# Altium footprint library LION.PcbLib: 90 footprints (part 11 of 13)
Each footprint in its own frame and in the unit in brackets; x right, y up, seen from the top. Pads: shape width x height; smd on the part's side, far side on the other; paste and mask are expansions set on the pad; w line width, h text height; cw(c..) or ccw(c..) is an arc to the next point about the centre after c.
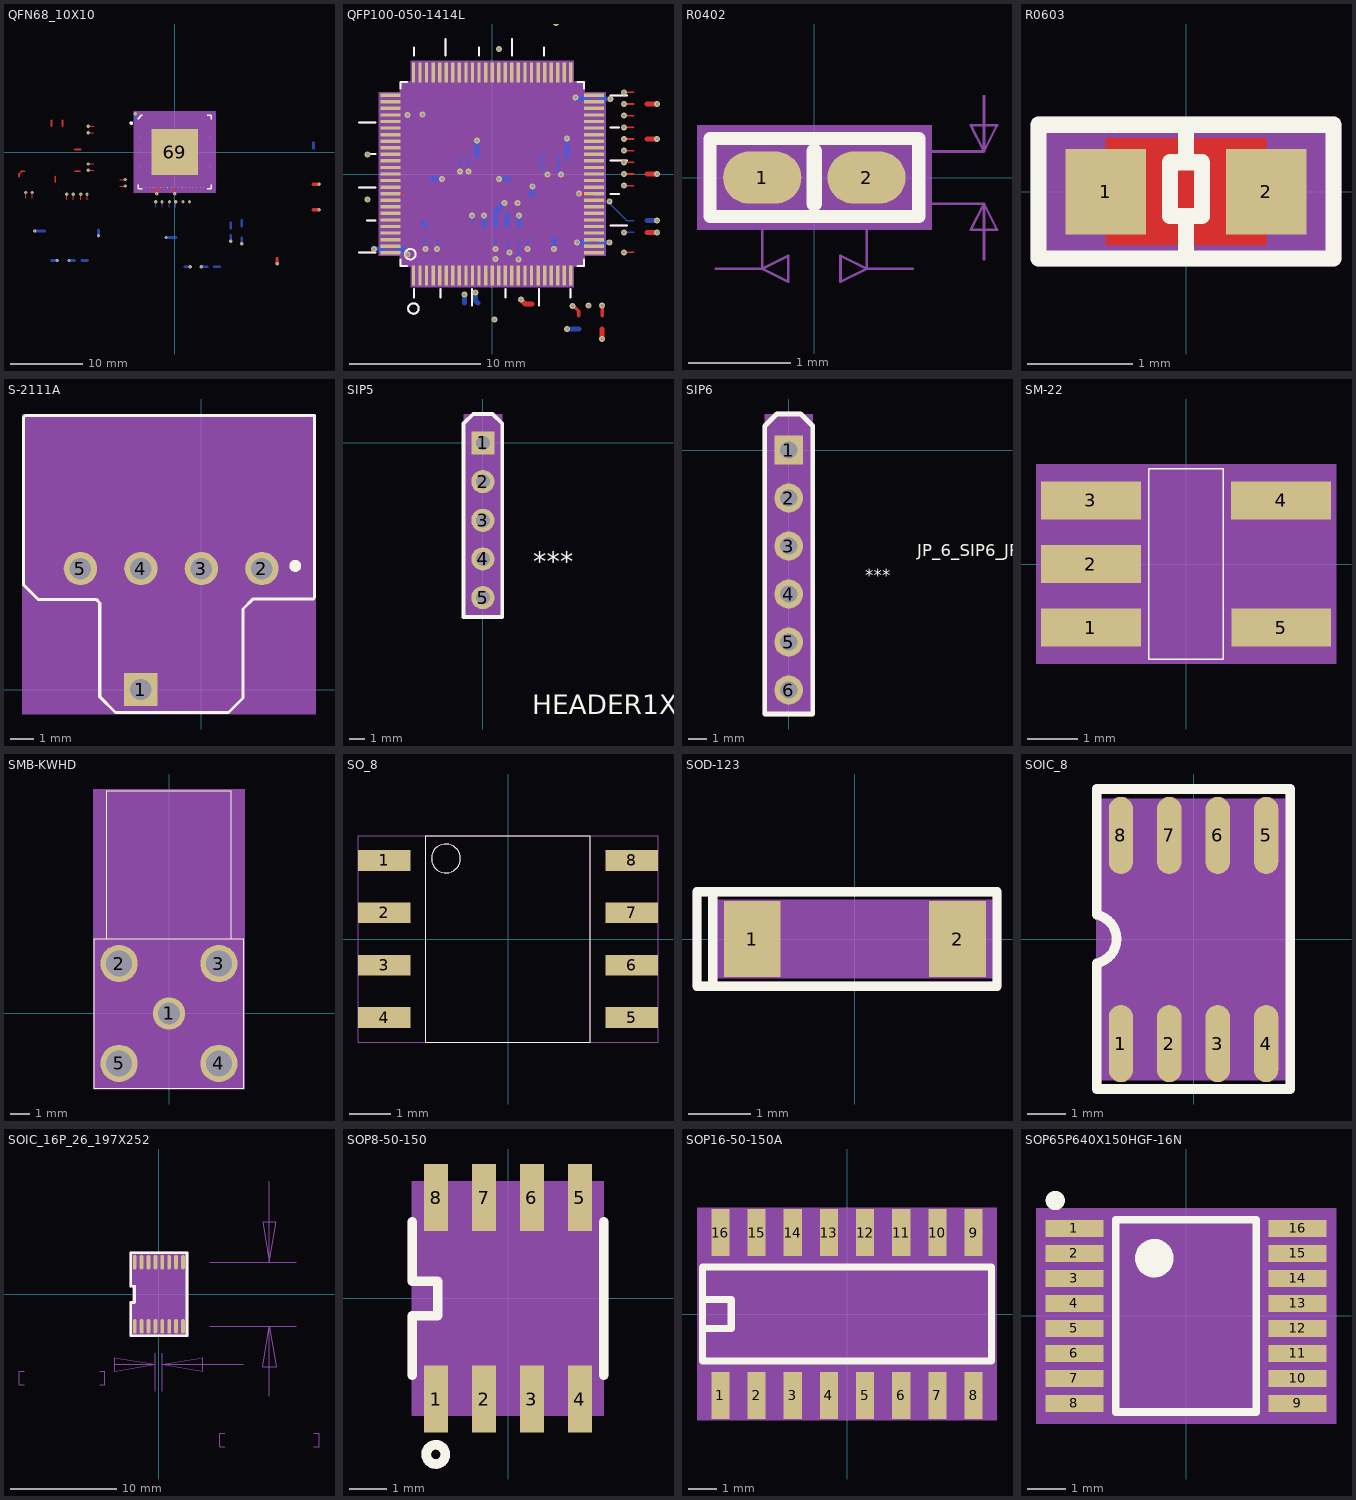
[diagram p10: the footprints below, top view; thin cyan lines are the x and y axes]

## QFN68_10X10 [mil] "QFN68_10X10"
pads (69):
  oct 1x1 smd: 1(-192.91,157.48) 2(-192.91,137.8) 3(-192.91,118.11) 4(-192.91,98.43) 5(-192.91,78.74) 6(-192.91,59.06) 7(-192.91,39.37) 8(-192.91,19.69) 9(-192.91,0) 10(-192.91,-19.69) 11(-192.91,-39.37) 12(-192.91,-59.06) 13(-192.91,-78.74) 14(-192.91,-98.43) 15(-192.91,-118.11) 16(-192.91,-137.8) 17(-192.91,-157.48) 18(-157.48,-192.91) 19(-137.8,-192.91) 20(-118.11,-192.91) 21(-98.43,-192.91) 22(-78.74,-192.91) 23(-59.06,-192.91) 24(-39.37,-192.91) 25(-19.69,-192.91) 26(0,-192.91) 27(19.69,-192.91) 28(39.37,-192.91) 29(59.06,-192.91) 30(78.74,-192.91) 31(98.43,-192.91) 32(118.11,-192.91) 33(137.8,-192.91) 34(157.48,-192.91) 35(192.91,-157.48) 36(192.91,-137.8) 37(192.91,-118.11) 38(192.91,-98.43) 39(192.91,-78.74) 40(192.91,-59.06) 41(192.91,-39.37) 42(192.91,-19.69) 43(192.91,0) 44(192.91,19.69) 45(192.91,39.37) 46(192.91,59.06) 47(192.91,78.74) 48(192.91,98.43) 49(192.91,118.11) 50(192.91,137.8) 51(192.91,157.48) 52(157.48,192.91) 53(137.8,192.91) 54(118.11,192.91) 55(98.43,192.91) 56(78.74,192.91) 57(59.06,192.91) 58(39.37,192.91) 59(19.69,192.91) 60(0,192.91) 61(-19.69,192.91) 62(-39.37,192.91) 63(-59.06,192.91) 64(-78.74,192.91) 65(-98.43,192.91) 66(-118.11,192.91) 67(-137.8,192.91) 68(-157.48,192.91)
  rect 251.97x251.97 smd: 69(0,0)
via 80,-270 diameter 18 hole 10
via 45,-270 diameter 18 hole 10
via -270,-185 diameter 18 hole 10
via -270,-150 diameter 18 hole 10
via -810,-220.5 diameter 18 hole 10
via -477,-230.5 diameter 18 hole 10
via -775,-220.5 diameter 18 hole 10
via -470,-65 diameter 18 hole 10
via -512,-230.5 diameter 18 hole 10
via -587,-230.5 diameter 18 hole 10
via -470,105 diameter 18 hole 10
via -470,140 diameter 18 hole 10
via -470,-100 diameter 18 hole 10
via -552,-230.5 diameter 18 hole 10
via -69,-270.5 diameter 18 hole 10
via -29,-270.5 diameter 18 hole 10
via 6,-270.5 diameter 18 hole 10
via -104,-270.5 diameter 18 hole 10
via -98.43,-227.6 diameter 18 hole 10
via 0,-227.6 diameter 18 hole 10
via 785,-175 diameter 18 hole 10
via 785,-315 diameter 18 hole 10
via 557,-608 diameter 18 hole 10
via 365,-498.5 diameter 18 hole 10
via 305,-485 diameter 18 hole 10
via 85,-625 diameter 18 hole 10
via 145,-625 diameter 18 hole 10
via -47.45,-465 diameter 18 hole 10
via -415,-455 diameter 18 hole 10
via -215,208.5 diameter 18 hole 10
via -575,-590 diameter 18 hole 10
via -640,-590 diameter 18 hole 10
via -762.45,-430 diameter 18 hole 10
Top Layer:
  lines w4: -810,-250.5 -810,-220.5 ; -775,-250.5 -775,-220.5 ; -587,-260.5 -587,-230.5 ; -552,-260.5 -552,-230.5 ; -512,-260.5 -512,-230.5 ; -477,-260.5 -477,-230.5 ; -470,-100 -440,-100 ; -470,-65 -440,-65 ; -470,105 -440,105 ; -470,140 -440,140 ; -300,-185 -270,-185 ; -300,-150 -270,-150
  lines w10: -847.55,-134.84 -847.55,-119.83 -831.99,-104.27 -815.83,-104.27 ; -670.16,139.83 -670.16,171.56 ; -650.47,-163.56 -650.47,-131.83 ; -611.1,139.83 -611.1,171.56 ; -544.17,-104.27 -515.7,-104.27 ; -544.17,13.84 -512.44,13.84 ; -98.43,-227.6 -98.43,-192.91 ; 0,-227.6 0,-192.91
  lines w15: 557,-608 557,-578
  lines w20: 755,-315 785,-315 ; 755,-175 785,-175
Bottom Layer:
  lines w4: -104,-300.5 -104,-270.5 ; -69,-300.5 -69,-270.5 ; -29,-300.5 -29,-270.5 ; 6,-300.5 6,-270.5
  lines w15: -762.45,-430 -707.5,-430 ; -670,-590 -640,-590 ; -575,-590 -545,-590 ; -505,-590 -475,-590 ; -415,-455 -415,-425 ; -215,177.5 -215,208.5 ; -47.45,-465 7.5,-465 ; 55,-625 85,-625 ; 145,-625 175,-625 ; 215,-625 245,-625 ; 305,-485 305,-455 ; 305,-415 305,-385 ; 365,-498.5 365,-467.5 ; 365,-402.5 365,-371.5 ; 755,20 755,50
Top Overlay:
  circle w9.84: c-236.22,157.48 r4.92
  lines w7.87: -198.82,-177.17 -198.82,-198.82 -177.17,-198.82 ; -198.82,177.17 -198.82,181.5 -181.5,198.82 -177.17,198.82 ; 177.17,-198.82 198.82,-198.82 198.82,-177.17 ; 177.17,198.82 198.82,198.82 198.82,177.17
  text ".Designator" at -135.05,-314.83 h25
Top Paste:
  pour cut-out: -94.88,-94.88 -94.88,-15.35 -15.35,-15.35 -15.35,-94.88
  pour cut-out: 15.35,-94.88 15.35,-15.35 94.88,-15.35 94.88,-94.88
  pour cut-out: -94.88,15.35 -94.88,94.88 -15.35,94.88 -15.35,15.35
  pour cut-out: 15.35,15.35 15.35,94.88 94.88,94.88 94.88,15.35
Mechanical 5:
  circle w9.84: c-236.22,157.48 r4.92
  lines w7.87: -198.82,-177.17 -198.82,-198.82 -177.17,-198.82 ; -198.82,177.17 -198.82,181.5 -181.5,198.82 -177.17,198.82 ; 177.17,-198.82 198.82,-198.82 198.82,-177.17 ; 177.17,198.82 198.82,198.82 198.82,177.17
  text "HMC7044LP10BE_0_QFN68_10X10_HMC" at 0,-590.47 h50
  text "U113" at -213.38,-358.18 h25
Mechanical 14:
  text "61" at -19.69,172.91 h25
  text "54" at 118.11,172.91 h25
  text "29" at 59.06,-212.91 h25
  text "30" at 78.74,-212.91 h25
  text "4" at -192.91,88.43 h25
  text "59" at 19.69,172.91 h25
  text "58" at 39.37,172.91 h25
  text "28" at 39.37,-212.91 h25
  text "27" at 19.69,-212.91 h25
  text "16" at -192.91,-157.8 h25
  text "15" at -192.91,-138.11 h25
  text "60" at 0,172.91 h25
  text "53" at 137.8,172.91 h25
  text "13" at -192.91,-98.74 h25
  text "14" at -192.91,-118.43 h25
  text "2" at -192.91,127.8 h25
  text "23" at -59.06,-212.91 h25
  text "3" at -192.91,108.11 h25
  text "1" at -192.91,147.48 h25
  text "24" at -39.37,-212.91 h25
  text "25" at -19.69,-212.91 h25
  text "22" at -78.74,-212.91 h25
  text "47" at 192.91,58.74 h25
  text "34" at 157.48,-212.91 h25
  text "33" at 137.8,-212.91 h25
  text "43" at 192.91,-20 h25
  text "42" at 192.91,-39.69 h25
  text "40" at 192.91,-79.06 h25
  text "39" at 192.91,-98.74 h25
  text "67" at -137.8,172.91 h25
  text "48" at 192.91,78.43 h25
  text "32" at 118.11,-212.91 h25
  text "65" at -98.43,172.91 h25
  text "45" at 192.91,19.37 h25
  text "55" at 98.43,172.91 h25
  text "7" at -192.91,29.37 h25
  text "46" at 192.91,39.06 h25
  text "64" at -78.74,172.91 h25
  text "9" at -192.91,-10 h25
  text "11" at -192.91,-59.37 h25
  text "12" at -192.91,-79.06 h25
  text "5" at -192.91,68.74 h25
  text "49" at 192.91,98.11 h25
  text "31" at 98.43,-212.91 h25
  text "52" at 157.48,172.91 h25
  text "63" at -59.06,172.91 h25
  text "62" at -39.37,172.91 h25
  text "6" at -192.91,49.06 h25
  text "20" at -118.11,-212.91 h25
  text "19" at -137.8,-212.91 h25
  text "18" at -157.48,-212.91 h25
  text "44" at 192.91,-0.31 h25
  text "50" at 192.91,117.8 h25
  text "66" at -118.11,172.91 h25
  text "8" at -192.91,9.69 h25
  text "51" at 192.91,137.48 h25
  text "10" at -192.91,-39.69 h25
  text "38" at 192.91,-118.43 h25
  text "21" at -98.43,-212.91 h25
  text "41" at 192.91,-59.37 h25
  text "26" at 0,-212.91 h25
  text "17" at -192.91,-177.48 h25
  text "68" at -157.48,172.91 h25
  text "57" at 59.06,172.91 h25
  text "56" at 78.74,172.91 h25
  text "37" at 192.91,-138.11 h25
  text "36" at 192.91,-157.8 h25
  text "35" at 192.91,-177.48 h25
  text "69" at 0,-20 h25
Mechanical 16:
  circle w3.94: c-158.46,158.46 r19.69
  circle w1.97: c0,0 r13.78
  pour cut-out: -222.44,-222.44 -222.44,222.44 222.44,222.44 222.44,-222.44
  region: -222.44,-222.44 -222.44,222.44 222.44,222.44 222.44,-222.44
  lines w1.97: -19.69,0 19.69,0 ; 0,-19.69 0,19.69
  lines w3.94: -197.83,-197.83 -197.83,197.83 197.83,197.83 197.83,-197.83 -197.83,-197.83
3D body: height 150, standoff 0, extent -222.44,-222.44 222.44,222.44

## QFP100-050-1414L [mil] "QFP100-050-1414L"
pads (100):
  rect 10x60 smd: 1(-236.22,-305.12) 2(-216.54,-305.12) 3(-196.85,-305.12) 4(-177.17,-305.12) 5(-157.48,-305.12) 6(-137.8,-305.12) 7(-118.11,-305.12) 8(-98.43,-305.12) 9(-78.74,-305.12) 10(-59.06,-305.12) 11(-39.37,-305.12) 12(-19.69,-305.12) 13(0,-305.12) 14(19.69,-305.12) 15(39.37,-305.12) 16(59.06,-305.12) 17(78.74,-305.12) 18(98.43,-305.12) 19(118.11,-305.12) 20(137.8,-305.12) 21(157.48,-305.12) 22(177.17,-305.12) 23(196.85,-305.12) 24(216.54,-305.12) 25(236.22,-305.12) 51(236.22,305.12) 52(216.54,305.12) 53(196.85,305.12) 54(177.17,305.12) 55(157.48,305.12) 56(137.8,305.12) 57(118.11,305.12) 58(98.43,305.12) 59(78.74,305.12) 60(59.06,305.12) 61(39.37,305.12) 62(19.69,305.12) 63(0,305.12) 64(-19.69,305.12) 65(-39.37,305.12) 66(-59.06,305.12) 67(-78.74,305.12) 68(-98.43,305.12) 69(-118.11,305.12) 70(-137.8,305.12) 71(-157.48,305.12) 72(-177.17,305.12) 73(-196.85,305.12) 74(-216.54,305.12) 75(-236.22,305.12)
  rect 60x10 smd: 26(305.12,-236.22) 27(305.12,-216.54) 28(305.12,-196.85) 29(305.12,-177.17) 30(305.12,-157.48) 31(305.12,-137.8) 32(305.12,-118.11) 33(305.12,-98.43) 34(305.12,-78.74) 35(305.12,-59.06) 36(305.12,-39.37) 37(305.12,-19.69) 38(305.12,0) 39(305.12,19.69) 40(305.12,39.37) 41(305.12,59.06) 42(305.12,78.74) 43(305.12,98.43) 44(305.12,118.11) 45(305.12,137.8) 46(305.12,157.48) 47(305.12,177.17) 48(305.12,196.85) 49(305.12,216.54) 50(305.12,236.22) 76(-305.12,236.22) 77(-305.12,216.54) 78(-305.12,196.85) 79(-305.12,177.17) 80(-305.12,157.48) 81(-305.12,137.8) 82(-305.12,118.11) 83(-305.12,98.43) 84(-305.12,78.74) 85(-305.12,59.06) 86(-305.12,39.37) 87(-305.12,19.69) 88(-305.12,0) 89(-305.12,-19.69) 90(-305.12,-39.37) 91(-305.12,-59.06) 92(-305.12,-78.74) 93(-305.12,-98.43) 94(-305.12,-118.11) 95(-305.12,-137.8) 96(-305.12,-157.48) 97(-305.12,-177.17) 98(-305.12,-196.85) 99(-305.12,-216.54) 100(-305.12,-236.22)
via 10,-255 diameter 18 hole 10
via 260.12,-59.06 diameter 18 hole 10
via 166.45,-1.84 diameter 18 hole 10
via 10,-225 diameter 18 hole 10
via 395,-175 diameter 18 hole 10
via -71.02,7.52 diameter 18 hole 10
via 395,-235 diameter 18 hole 10
via 351.5,-205 diameter 18 hole 10
via 355,225 diameter 18 hole 10
via 495,0 diameter 18 hole 10
via 495,210 diameter 18 hole 10
via 495,105 diameter 18 hole 10
via -355,-225 diameter 18 hole 10
via -50,-355 diameter 18 hole 10
via 78.74,-256 diameter 18 hole 10
via -96.61,7.52 diameter 18 hole 10
via 206.45,-1.84 diameter 18 hole 10
via 289.65,-394.94 diameter 18 hole 10
via 330,-395 diameter 18 hole 10
via 105.95,-224.64 diameter 18 hole 10
via 351.45,-81.84 diameter 18 hole 10
via 241.65,-396.14 diameter 18 hole 10
via -373.55,-76.84 diameter 18 hole 10
via -373.55,59.06 diameter 18 hole 10
via 52,-235 diameter 18 hole 10
via -165,-225 diameter 18 hole 10
via 395,35 diameter 18 hole 10
via 395,0 diameter 18 hole 10
via 395,-35 diameter 18 hole 10
via 395,105 diameter 18 hole 10
via 395,140 diameter 18 hole 10
via 395,175 diameter 18 hole 10
via 395,210 diameter 18 hole 10
via 395,245 diameter 18 hole 10
via 395,70 diameter 18 hole 10
via -208.55,178.16 diameter 18 hole 10
via -253.55,177.17 diameter 18 hole 10
via 191.45,453.16 diameter 18 hole 10
via 495,-175 diameter 18 hole 10
via 80,-125 diameter 18 hole 10
via 20,375 diameter 18 hole 10
via -200,-225 diameter 18 hole 10
via -60,-125 diameter 18 hole 10
via 36.45,-86.84 diameter 18 hole 10
via 76.45,-86.84 diameter 18 hole 10
via 330,-495 diameter 18 hole 10
via 20,-15 diameter 18 hole 10
via 225,-465 diameter 18 hole 10
via 224.57,107.06 diameter 18 hole 10
via 255,-205 diameter 18 hole 10
via 495,-140 diameter 18 hole 10
via 250,230 diameter 18 hole 10
via 6.45,-436.84 diameter 18 hole 10
via 86.45,-376.84 diameter 18 hole 10
via 185,-225 diameter 18 hole 10
via -83.55,-361.84 diameter 18 hole 10
via -45.43,100.51 diameter 18 hole 10
via -25,-125 diameter 18 hole 10
via 121.45,-36.84 diameter 18 hole 10
via -253.55,-241.84 diameter 18 hole 10
via -150,-15 diameter 18 hole 10
Top Layer:
  lines w5: -305.12,-59.06 -267.62,-59.06 ; 395,-235 425,-235 ; 395,-35 425,-35 ; 395,0 425,0 ; 395,35 425,35 ; 395,70 425,70 ; 395,105 425,105 ; 395,140 425,140 ; 395,175 425,175 ; 395,210 425,210 ; 395,245 425,245
  lines w10: 241.65,-396.14 244.85,-396.14 260,-411.29 260,-425 ; 260.12,-59.06 305.12,-59.06 ; 330,-425 330,-395
  lines w15: 86.45,-376.84 99.61,-390 120,-390 ; 330,-495 330,-465 ; 465,-175 495,-175 ; 465,0 495,0 ; 465,105 495,105 ; 465,210 495,210
Bottom Layer:
  lines w4: -96.61,7.52 -96.61,54.02 ; -71.02,7.52 -71.02,54.02
  lines w5: -200,-225 -200,-195 ; -165,-225 -165,-195 ; -60,-155 -60,-125 ; 10,-225 10,-195 ; 45,-195 45,-228 52,-235 ; 78.74,-256 80,-254.74 80,-195 ; 105.95,-224.64 105.95,-204.05 115,-195 ; 147.8,54.02 147.8,16.81 166.45,-1.84 ; 198.98,54.02 198.98,5.63 206.45,-1.84 ; 351.45,-81.84 351.45,-86.84 404.61,-140 425,-140 ; 395,-175 425,-175
  lines w15: -355,-225 -325,-225 ; -285,-225 -270.39,-225 -253.55,-241.84 ; -208.39,-146.61 -200,-155 ; -180,-15 -150,-15 ; -83.55,-361.84 -83.55,-386.34 -83.05,-386.84 ; -50,-355 -50,-379.89 -43.05,-386.84 ; -45.43,54.02 -45.43,100.51 ; -25,-155 -25,-125 ; 10,-155 10,-113.29 36.45,-86.84 ; 20,-15 50,-15 ; 45,-155 45,-118.29 ; 80,-155 80,-125 ; 115,-65 121.45,-58.55 121.45,-36.84 ; 185,-225 185,-195 ; 224.57,54.02 224.57,107.06 ; 225,-465 260,-465 ; 250,230 255,225 285,225 ; 255,-205 285,-205 ; 325,-205 351.5,-205 ; 325,225 355,225 ; 465,-140 495,-140
Top Overlay:
  circle w6: c-245.59,-240.59 r15.8
  circle w6: c-245.59,-240.59 r15.8
  circle w6: c-236.22,-403.54 r15.75
  lines w6: -400,-235 -350,-235 ; -400,-40 -350,-40 ; -400,155 -350,155 ; -375,-140 -350,-140 ; -375,60 -350,60 ; -275.59,-255.91 -275.59,-275.59 -255.91,-275.59 ; -275.59,255.91 -275.59,275.59 -255.91,275.59 ; -235,-370 -235,-345 ; -235,355 -235,380 ; -155,-370 -155,-345 ; -140,355 -140,405 ; -60,-395 -60,-345 ; -40,355 -40,380 ; 40,-370 40,-345 ; 60,355 60,405 ; 140,-395 140,-345 ; 155,355 155,380 ; 235,-370 235,-345 ; 255.91,-275.59 275.59,-275.59 275.59,-255.91 ; 255.91,275.59 275.59,275.59 275.59,255.91 ; 355,-155 405,-155 ; 355,-60 380,-60 ; 355,40 405,40 ; 355,140 380,140 ; 355,235 405,235
Mechanical 5:
  circle w6: c-236.22,-403.54 r15.75
  lines w6: -400,-235 -350,-235 ; -400,-40 -350,-40 ; -400,155 -350,155 ; -375,-140 -350,-140 ; -375,60 -350,60 ; -275.59,-255.91 -275.59,-275.59 -255.91,-275.59 ; -275.59,255.91 -275.59,275.59 -255.91,275.59 ; -235,-370 -235,-345 ; -235,355 -235,362 ; -155,-370 -155,-345 ; -140,355 -140,405 ; -60,-395 -60,-345 ; -40,355 -40,380 ; 40,-370 40,-345 ; 60,355 60,405 ; 140,-395 140,-345 ; 155,355 155,380 ; 235,-370 235,-345 ; 255.91,-275.59 275.59,-275.59 275.59,-255.91 ; 255.91,275.59 275.59,275.59 275.59,255.91 ; 355,-155 405,-155 ; 355,-60 380,-60 ; 355,40 405,40 ; 355,140 380,140 ; 355,235 405,235 ; -261.39,-240.59 ccw(c-245.59,-240.59) -245.59,-256.39 ; -261.39,-240.59 cw(c-245.59,-240.59) -245.59,-224.79 ; -261.39,-240.59 ccw(c-245.59,-240.59) -245.59,-256.39 ; -261.39,-240.59 cw(c-245.59,-240.59) -245.59,-224.79 ; -245.59,-256.39 ccw(c-245.59,-240.59) -229.79,-240.59 ; -245.59,-256.39 ccw(c-245.59,-240.59) -229.79,-240.59 ; -245.59,-224.79 cw(c-245.59,-240.59) -229.79,-240.59 ; -245.59,-224.79 cw(c-245.59,-240.59) -229.79,-240.59
  text "STM32F103VE_0_QFP100-050-1414L_" at -334.65,590.55 h25
  text "U84" at -476.89,64.82 h25
Mechanical 14:
  text "69" at -118.11,241.12 h80
  text "7" at -118.11,-337.12 h80
  text "62" at 19.69,241.12 h80
  text "60" at 59.06,241.12 h80
  text "61" at 39.37,241.12 h80
  text "58" at 98.43,241.12 h80
  text "57" at 118.11,241.12 h80
  text "56" at 137.8,241.12 h80
  text "96" at -305.12,-221.48 h80
  text "89" at -305.12,-83.69 h80
  text "77" at -305.12,152.54 h80
  text "91" at -305.12,-123.06 h80
  text "90" at -305.12,-103.37 h80
  text "47" at 305.12,113.17 h80
  text "48" at 305.12,132.85 h80
  text "68" at -98.43,241.12 h80
  text "67" at -78.74,241.12 h80
  text "59" at 78.74,241.12 h80
  text "73" at -196.85,241.12 h80
  text "70" at -137.8,241.12 h80
  text "80" at -305.12,93.48 h80
  text "8" at -98.43,-337.12 h80
  text "9" at -78.74,-337.12 h80
  text "63" at 0,241.12 h80
  text "64" at -19.69,241.12 h80
  text "65" at -39.37,241.12 h80
  text "66" at -59.06,241.12 h80
  text "81" at -305.12,73.8 h80
  text "86" at -305.12,-24.63 h80
  text "87" at -305.12,-44.31 h80
  text "88" at -305.12,-64 h80
  text "55" at 157.48,241.12 h80
  text "97" at -305.12,-241.17 h80
  text "98" at -305.12,-260.85 h80
  text "1" at -236.22,-337.12 h80
  text "2" at -216.54,-337.12 h80
  text "3" at -196.85,-337.12 h80
  text "6" at -137.8,-337.12 h80
  text "37" at 305.12,-83.69 h80
  text "36" at 305.12,-103.37 h80
  text "71" at -157.48,241.12 h80
  text "14" at 19.69,-369.12 h80
  text "35" at 305.12,-123.06 h80
  text "54" at 177.17,241.12 h80
  text "53" at 196.85,241.12 h80
  text "52" at 216.54,241.12 h80
  text "51" at 236.22,241.12 h80
  text "32" at 305.12,-182.11 h80
  text "95" at -305.12,-201.8 h80
  text "15" at 39.37,-369.12 h80
  text "72" at -177.17,241.12 h80
  text "33" at 305.12,-162.43 h80
  text "30" at 305.12,-221.48 h80
  text "12" at -19.69,-369.12 h80
  text "94" at -305.12,-182.11 h80
  text "26" at 305.12,-300.22 h80
  text "28" at 305.12,-260.85 h80
  text "50" at 305.12,172.22 h80
  text "100" at -305.12,-332.22 h80
  text "11" at -39.37,-369.12 h80
  text "75" at -236.22,241.12 h80
  text "17" at 78.74,-369.12 h80
  text "76" at -305.12,172.22 h80
  text "13" at 0,-369.12 h80
  text "29" at 305.12,-241.17 h80
  text "31" at 305.12,-201.8 h80
  text "24" at 216.54,-369.12 h80
  text "25" at 236.22,-369.12 h80
  text "21" at 157.48,-369.12 h80
  text "22" at 177.17,-369.12 h80
  text "18" at 98.43,-369.12 h80
  text "34" at 305.12,-142.74 h80
  text "23" at 196.85,-369.12 h80
  text "93" at -305.12,-162.43 h80
  text "92" at -305.12,-142.74 h80
  text "85" at -305.12,-4.94 h80
  text "16" at 59.06,-369.12 h80
  text "5" at -157.48,-337.12 h80
  text "40" at 305.12,-24.63 h80
  text "39" at 305.12,-44.31 h80
  text "38" at 305.12,-64 h80
  text "42" at 305.12,14.74 h80
  text "43" at 305.12,34.43 h80
  text "44" at 305.12,54.11 h80
  text "45" at 305.12,73.8 h80
  text "46" at 305.12,93.48 h80
  text "41" at 305.12,-4.94 h80
  text "78" at -305.12,132.85 h80
  text "79" at -305.12,113.17 h80
  text "82" at -305.12,54.11 h80
  text "84" at -305.12,14.74 h80
  text "83" at -305.12,34.43 h80
  text "4" at -177.17,-337.12 h80
  text "27" at 305.12,-280.54 h80
  text "49" at 305.12,152.54 h80
  text "20" at 137.8,-369.12 h80
  text "19" at 118.11,-369.12 h80
  text "10" at -59.06,-369.12 h80
  text "99" at -305.12,-280.54 h80
  text "74" at -216.54,241.12 h80
Mechanical 16:
  circle w6: c-245.59,-240.59 r15.8
  region: -245,-340 -245,-275.59 -275.59,-275.59 -275.59,-245 -340,-245 -340,245 -275.59,245 -275.59,275.59 -245,275.59 -245,340 245,340 245,275.59 275.59,275.59 275.59,245 340,245 340,-245 275.59,-245 275.59,-275.59 245,-275.59 245,-340
  lines w6: -275.59,-240.59 -240.59,-275.59 ; -275.59,-275.59 275.59,-275.59 275.59,275.59 -275.59,275.59 -275.59,-275.59
Mechanical 17:
  text "QFP100-050-1414L" at -334.65,669.29 h25
  text "STM32F103VE_0_QFP100-050-1414L_" at -334.65,511.81 h25
  text ".Designator" at 95.5,16.67 h25
3D body: height 150, standoff 0, extent -340,-340 340,340

## R0402 [mil] "R0402"
pads (2):
  oval 30x20 smd: 1(-20,0) 2(20,0)
Top Overlay:
  lines w5: -40,-15 40,-15 40,15 -40,15 -40,-15
  lines w6: 0,-10 0,10
Mechanical 5:
  lines w5: -40,-15 40,-15 40,15 -40,15 -40,-15
  lines w6: 0,-10 0,10
  text "R5783" at -60,-10 h25
  text "RESISTOR_R0402_5.1K" at 270,35 h25
Mechanical 13:
  lines w1: -37.75,-35 -20,-35 ; -20,0 -20,-35 ; 20,-10 65,-10 ; 20,0 20,-35 ; 20,10 65,10 ; 37.75,-35 20,-35 ; 65,-31.25 65,-10 ; 65,31.25 65,10 ; -20,-35 -10,-30 -10,-40 -20,-35 ; 20,-35 10,-40 10,-30 20,-35 ; 65,-10 70,-20 60,-20 65,-10 ; 65,10 60,20 70,20 65,10
  text "20" at 46,-12.5 h25
  text "40" at -19,-47.5 h25
Mechanical 14:
  text "2" at 30,0 h25
  text "1" at -10,0 h25
Mechanical 16:
  pour cut-out: 45,-20 45,20 -45,20 -45,-20
  region: -37,-12 37,-12 37,12 -37,12
  lines w1: -20,-10 20,-10 20,10 -20,10 -20,-10
  lines w5: -40,-15 40,-15 40,15 -40,15 -40,-15
  lines w6: 0,-10 0,10
Mechanical 17:
  text "5.1K" at 15,-20 h25
  text ".Designator" at 20,-1 h10
3D body: height 150, standoff 0, extent -37,-12 37,12

## R0603 [mil] "R0603"
pads (2):
  rect 30x32 smd: 1(-30,0) 2(30,0)
Top Layer:
  region: -30,-20 -30,20 30,20 30,-20
  region: -10,-20 -10,20 10,20 10,-20
Top Overlay:
  lines w6: 0,-25 0,-10 ; 0,24 0,11 ; 0,11 -6,11 -6,-9 6,-9 6,11 0,11 ; -55,-25 55,-25 55,25 -55,25 -55,-25
Mechanical 14:
  text "1" at -40,0 h25
  text "2" at 20,0 h25
Mechanical 16:
  region: -56,-25 -56,27 56,27 56,-25
  lines w6: 0,-25 0,-10 ; 0,24 0,11 ; 0,11 -6,11 -6,-9 6,-9 6,11 0,11 ; -55,-25 55,-25 55,25 -55,25 -55,-25
Mechanical 20:
  text "1.21K/1%" at 59,148 h25
  text "RESISTOR_R0603_1.21K/1%" at -241,148 h25
  text "SR0603" at -66,209 h25
3D body: height 150, standoff 0, extent -56,-25 56,27

## S-2111A [mil] "S-2111A"
pads (5):
  rect 55.12x55.12 hole 35.43: 1(-100,0)
  round 55.12 hole 35.43: 2(100,200) 3(0,200) 4(-100,200) 5(-200,200)
Top Overlay:
  circle w9.84: c155.14,204.39 r4.92
  lines w5: -294,173 -294,450 -291,453 187,453 187,152 185,150 86,150 69,133 69,-14 45,-38 -1,-38 -142,-38 -168,-12 -168,143 -174,149 -270,149 -294,173
Mechanical 5:
  circle w9.84: c155.14,204.39 r4.92
  lines w5: -294,173 -294,450 -291,453 187,453 187,152 185,150 86,150 69,133 69,-14 45,-38 -1,-38 -142,-38 -168,-12 -168,143 -174,149 -270,149 -294,173
  text "U41" at 112.55,39.84 h25
  text "S2111A_S-2111A_S-2011A" at -65,536 h25
Mechanical 14:
  text "3" at 0,210 h25
  text "5" at -200,210 h25
  text "2" at 100,210 h25
  text "1" at -100,10 h25
  text "4" at -100,210 h25
Mechanical 16:
  circle w3.94: c-200,200 r27.56
  circle w3.94: c-100,200 r27.56
  circle w3.94: c0,200 r27.56
  circle w3.94: c100,200 r27.56
  circle w1.97: c0,0 r13.78
  region: -296.5,-40.5 189.5,-40.5 189.5,455.5 -296.5,455.5
  lines w1.97: -19.69,0 19.69,0 ; 0,-19.69 0,19.69
  lines w3.94: -127.56,-27.56 -127.56,27.56 -72.44,27.56 -72.44,-27.56 -127.56,-27.56
Mechanical 17:
  text ".Designator" at -70.17,237.5 h25
3D body: height 150, standoff 0, extent -296.5,-40.5 189.5,455.5

## SIP5 [mil] "SIP5"
pads (5):
  rect 60x60 / inner rect 55x55 / far side rect 60x60 hole 36: 1(0,0)
  round 60 / inner round 55 / far side round 60 hole 36: 2(0,-100) 3(0,-200) 4(0,-300) 5(0,-400)
Top Overlay:
  lines w10: -50,-450 -50,50 -25,75 25,75 50,50 50,-450 -50,-450
  text ".Designator" at 97.5,-242.5 h25
  text "HEADER1X5_SIP5_HEADER1X5" at 128,-701 h50
  text "***" at 130,-332 h50
Mechanical 14:
  text "4" at 0,-324.8 h31
  text "2" at 0,-124.8 h31
  text "3" at 0,-224.8 h31
  text "1" at 0,-24.8 h31
  text "5" at 0,-424.8 h31
Mechanical 16:
  region: -50,-450 50,-450 50,75 -50,75
  lines w1: -50,-450 -50,50 -25,75 25,75 50,50 50,-450 -50,-450
Mechanical 17:
  text "***" at -21,-507 h50
3D body: height 150, standoff 0, extent -50,-450 50,75

## SIP6 [mil] "SIP6"
pads (6):
  rect 60x60 / inner rect 55x55 / far side rect 60x60 hole 36: 1(0,0)
  round 60 / inner round 55 / far side round 60 hole 36: 2(0,-100) 3(0,-200) 4(0,-300) 5(0,-400) 6(0,-500)
Top Overlay:
  lines w10: -50,-550 -50,50 -25,75 25,75 50,50 50,-550 -50,-550
  text ".Designator" at 25,-570 h25
  text "JP_6_SIP6_JP_6" at 268,-221 h25
  text "***" at 160,-272 h25
Mechanical 5:
  lines w10: -50,-550 -50,50 -25,75 25,75 50,50 50,-550 -50,-550
  text "***" at 186.66,-228.66 h25
  text "JP_6_SIP6_JP_6" at 259.66,-212.66 h25
  text "J5" at 25.01,-570 h25
Mechanical 14:
  text "4" at 8,-300 h10
  text "6" at 8,-500 h10
  text "3" at 8,-200 h10
  text "5" at 8,-400 h10
  text "1" at 8,0 h10
  text "2" at 8,-100 h10
Mechanical 16:
  region: -50,-550 50,-550 50,75 -50,75
  lines w1: -50,-550 -50,50 -25,75 25,75 50,50 50,-550 -50,-550
Mechanical 17:
  text "***" at 9,-447 h25
3D body: height 150, standoff 0, extent -50,-550 50,75

## SM-22 [mil] "SM-22"
pads (5):
  rect 78.7x29.9 smd: 1(-74.8,-50) 2(-74.8,0) 3(-74.8,50) 4(74.8,50) 5(75,-50)
Top Overlay:
  lines w1: -29.5,-75 29.5,-75 29.5,75 -29.5,75 -29.5,-75
Mechanical 5:
  lines w1: -29.5,-75 29.5,-75 29.5,75 -29.5,75 -29.5,-75
  text "T14" at 37.85,144.45 h25
Mechanical 14:
  text "4" at 82.8,50 h20
  text "2" at -66.8,0 h20
  text "3" at -66.8,50 h20
  text "5" at 95,-50 h25
  text "1" at -66.8,-50 h20
Mechanical 16:
  region: -118.1,78.7 -118.1,-78.7 118.1,-78.7 118.1,78.7
  lines w1: -29.6,59.9 -29.4,59.9 -14.4,74.8 ; -29.5,-75 29.5,-75 29.5,75 -29.5,75 -29.5,-75
3D body: height 150, standoff 0, extent -118.1,-78.7 118.1,78.7

## SMB-KWHD [mil] "SMB-KWHD"
pads (5):
  round 65 / inner round 55 / far side round 65 hole 44: 1(0,0)
  round 75 / inner round 65 / far side round 75 hole 52: 2(-100.39,100.39) 3(100.39,100.39) 4(100.39,-100.39) 5(-100.39,-100.39)
Top Overlay:
  lines w1: -125.39,150.47 -125.39,448.03 125.39,448.03 125.39,150.47 ; -150.59,-150.59 150.59,-150.59 150.59,150.59 -150.59,150.59 -150.59,-150.59
Mechanical 5:
  lines w1: -125.39,150.47 -125.39,448.03 125.39,448.03 125.39,150.47 ; -150.59,-150.59 150.59,-150.59 150.59,150.59 -150.59,150.59 -150.59,-150.59
  text "J10" at 175.05,9.55 h25
Mechanical 14:
  text "1" at 0,28 h35
  text "2" at -100.39,128.39 h35
  text "3" at 100.39,128.39 h35
  text "4" at 100.39,-72.39 h35
  text "5" at -100.39,-72.39 h35
Mechanical 16:
  region: -151.89,-151.89 151.89,-151.89 151.89,451.42 -151.89,451.42
  lines w1: -125.39,150.47 -125.39,451.42 ; -125.39,448.03 125.39,448.03 125.39,150.47 ; -150.59,-150.59 150.59,-150.59 150.59,150.59 -150.59,150.59 -150.59,-150.59
3D body: height 150, standoff 0, extent -151.89,-151.89 151.89,451.42

## SO_8 [mm] "SO_8"
pads (8):
  rect 1.27x0.5 smd: 1(-3,1.905) 2(-3,0.635) 3(-3,-0.635) 4(-3,-1.905) 5(3,-1.905) 6(3,-0.635) 7(3,0.635) 8(3,1.905)
Top Overlay:
  circle w0.025: c-1.506,1.954 r0.351
  lines w0.025: -2,-2.5 2,-2.5 2,2.5 -2,2.5 -2,-2.5
  text ".Designator" at -1.143,2.857 h0.64
Mechanical 5:
  lines w0.025: -2,-2.5 2,-2.5 2,2.5 -2,2.5 -2,-2.5 ; -1.857,1.954 ccw(c-1.506,1.954) -1.506,1.603 ccw(c-1.506,1.954) -1.155,1.954 ccw(c-1.506,1.954) -1.506,2.305 ccw(c-1.506,1.954) -1.857,1.954
  text "U8" at 1.058,1.926 h0.64
Mechanical 14:
  text "7" at 2.797,0.635 h0.51
  text "3" at -3.203,-0.635 h0.51
  text "4" at -3.203,-1.905 h0.51
  text "5" at 2.797,-1.905 h0.51
  text "2" at -3.203,0.635 h0.51
  text "8" at 2.797,1.905 h0.51
  text "1" at -3.203,1.905 h0.51
  text "6" at 2.797,-0.635 h0.51
Mechanical 16:
  lines w0.025: -3.64,-2.5 3.64,-2.5 ; -3.64,-2.5 -3.64,2.5 ; -3.64,-2.5 3.64,-2.5 ; -3.64,-2.5 -3.64,2.5 ; -3.64,2.5 3.64,2.5 ; -3.64,2.5 3.64,2.5 ; 3.64,-2.5 3.64,2.5 ; 3.64,-2.5 3.64,2.5 ; -2,-2.5 2,-2.5 2,2.5 -2,2.5 -2,-2.5

## SOD-123 [mil] "SOD-123"
pads (2):
  rect 36x48 smd: 1(-65,0) 2(65,0)
Top Overlay:
  lines w6: -90,-30 -90,30 ; -90,-30 90,-30 90,30 -90,30 ; -90,-30 -100,-30 -100,30 -90,30
Mechanical 5:
  lines w6: -90,-30 -100,-30 -100,30 -90,30 ; -90,-30 90,-30 90,30 -90,30 ; -90,-30 -90,30
  text "D1" at -142.5,17.5 h25
Mechanical 14:
  text "2" at 65,10 h25
  text "1" at -65,10 h25
Mechanical 16:
  region: -89,-25 89,-25 89,25 -89,25
  lines w1: -89,-18 89,-18 89,18 -89,18 -89,-18
Mechanical 17:
  text "MBR0530" at -100,-100 h60
3D body: height 150, standoff 0, extent -89,-25 89,25

## SOIC_8 [mil] "SOIC_8"
pads (8):
  oval 25.2x79.9 smd: 1(-75,-107.5) 2(-25,-107.5) 3(25,-107.5) 4(75,-107.5) 5(75,107.5) 6(25,107.5) 7(-25,107.5) 8(-75,107.5)
Top Overlay:
  lines w10: -100,-154.5 100,-154.5 100,155.5 -100,155.5 -100,25.5 cw(c-105.01,0.5) -100,-24.5 -100,-154.5
Mechanical 5:
  lines w10: -100,-154.5 -100,-24.5 ccw(c-105.01,0.5) -100,25.5 -100,155.5 100,155.5 100,-154.5 -100,-154.5
  text "U118" at -40,-69.5 h25
Mechanical 14:
  text "8" at -75,87.5 h50
  text "5" at 75,87.5 h50
  text "4" at 75,-127.5 h50
  text "2" at -25,-127.5 h50
  text "1" at -75,-127.5 h50
  text "3" at 25,-127.5 h50
  text "7" at -25,87.5 h50
  text "6" at 25,87.5 h50
Mechanical 16:
  region: -100,-144.5 -100,145.5 100,145.5 100,-144.5
  lines w1: -100,-145 100,-145 100,145.5 -100,145.5 -100,-145
Mechanical 17:
  text ".Designator" at -130,-220 h25
3D body: height 150, standoff 0, extent -100,-144.5 100,145.5

## SOIC_16P_26_197X252 [mil] "SOIC_16P_26_197X252"
pads (16):
  oval 14x54 smd: 1(-89.57,-118.98) 2(-63.98,-118.98) 3(-38.39,-118.98) 4(-12.8,-118.98) 5(12.8,-118.98) 6(38.39,-118.98) 7(63.98,-118.98) 8(89.57,-118.98) 9(89.57,118.98) 10(63.98,118.98) 11(38.39,118.98) 12(12.8,118.98) 13(-12.8,118.98) 14(-38.39,118.98) 15(-63.98,118.98) 16(-89.57,118.98)
Top Overlay:
  lines w10: -104.57,-153.98 -94.57,-153.98 104.57,-153.98 104.57,-143.98 104.57,153.98 94.57,153.98 -104.57,153.98 -104.57,30 -90,30 -90,-30 -104.57,-30 -104.57,-153.98
  text ".Designator" at 162.5,-12.5 h25
Mechanical 5:
  lines w10: -104.57,-153.98 -94.57,-153.98 104.57,-153.98 104.57,-143.98 104.57,153.98 94.57,153.98 -104.57,153.98 -104.57,30 -90,30 -90,-30 -104.57,-30 -104.57,-153.98
  text "U69" at 162.5,-12.5 h25
Mechanical 13:
  lines w1: -500,-335 -519,-335 -519,-285 -500,-285 ; -220,-335 -201,-335 -201,-285 -220,-285 ; -163.5,-260 -12.8,-260 ; -12.8,-360 -12.8,-218.98 ; 12.8,-360 12.8,-218.98 ; 189.57,-118.98 510,-118.98 ; 189.57,118.98 510,118.98 ; 244.5,-565 225.5,-565 225.5,-515 244.5,-515 ; 312.8,-260 12.8,-260 ; 410,-377.5 410,-118.98 ; 410,418.98 410,118.98 ; 575.5,-565 594.5,-565 594.5,-515 575.5,-515 ; -12.8,-260 -162.8,-285 -162.8,-235 -12.8,-260 ; 12.8,-260 162.8,-235 162.8,-285 12.8,-260 ; 410,-118.98 435,-268.98 385,-268.98 410,-118.98 ; 410,118.98 385,268.98 435,268.98 410,118.98
  text "0.65" at -455.5,-235 h36
  text "25.59" at -481,-335 h36
  text "6.04" at 314.5,-465 h36
  text "237.97" at 263.5,-565 h36
Mechanical 14:
  text "16" at -67.17,118.98 h28
  text "10" at 86.38,118.98 h28
  text "11" at 60.79,118.98 h28
  text "12" at 35.2,118.98 h28
  text "13" at 9.6,118.98 h28
  text "6" at 49.59,-118.98 h28
  text "7" at 75.18,-118.98 h28
  text "4" at -1.6,-118.98 h28
  text "5" at 24,-118.98 h28
  text "1" at -78.37,-118.98 h28
  text "8" at 100.77,-118.98 h28
  text "9" at 100.77,118.98 h28
  text "2" at -52.78,-118.98 h28
  text "3" at -27.19,-118.98 h28
  text "14" at -15.99,118.98 h28
  text "15" at -41.58,118.98 h28
Mechanical 16:
  pour cut-out: -104.57,153.98 104.57,153.98 104.57,-153.98 -104.57,-153.98 -104.57,-30 -90,-30 -90,30 -104.57,30
  region: -96.65,-125.91 -96.65,-86.61 -98.43,-86.61 -98.43,86.61 -96.65,86.61 -96.65,125.91 -82.48,125.91 -82.48,86.61 -71.06,86.61 -71.06,125.91 -56.89,125.91 -56.89,86.61 -45.47,86.61 -45.47,125.91 -31.3,125.91 -31.3,86.61 -19.88,86.61 -19.88,125.91 -5.71,125.91 -5.71,86.61 5.71,86.61 5.71,125.91 19.88,125.91 19.88,86.61 31.3,86.61 31.3,125.91 45.47,125.91 45.47,86.61 56.89,86.61 56.89,125.91 71.06,125.91 71.06,86.61 82.48,86.61 82.48,125.91 96.65,125.91 96.65,86.61 98.43,86.61 98.43,-86.61 96.65,-86.61 96.65,-125.91 82.48,-125.91 82.48,-86.61 71.06,-86.61 71.06,-125.91 56.89,-125.91 56.89,-86.61 45.47,-86.61 45.47,-125.91 31.3,-125.91 31.3,-86.61 19.88,-86.61 19.88,-125.91 5.71,-125.91 5.71,-86.61 -5.71,-86.61 -5.71,-125.91 -19.88,-125.91 -19.88,-86.61 -31.3,-86.61 -31.3,-125.91 -45.47,-125.91 -45.47,-86.61 -56.89,-86.61 -56.89,-125.91 -71.06,-125.91 -71.06,-86.61 -82.48,-86.61 -82.48,-125.91
3D body: height 150, standoff 0, extent -98.43,-125.91 98.43,125.91

## SOP8-50-150 [mil] "SOP8-50-150"
pads (8):
  rect 25x70 smd: 1(-75,-105) 2(-25,-105) 3(25,-105) 4(75,-105) 5(75,105) 6(25,105) 7(-25,105) 8(-75,105)
Top Overlay:
  circle w10: c-75.23,-162.68 r9.99
  lines w10: -100,-80 -100,-18 -73.09,-18 -73.09,18 -100,18 -100,80 ; 100,-80 100,80
Mechanical 5:
  circle w10: c-75.23,-162.68 r9.99
  lines w10: -100,-80 -100,-18 -73.09,-18 -73.09,18 -100,18 -100,80 ; 100,-80 100,80
  text "ACS712_SOP8-50-150_ACS712ELCTR-" at -122.62,217.76 h62.99
  text "U83" at 67.67,-184.95 h25
Mechanical 14:
  text "7" at -21,105 h10
  text "1" at -71,-105 h10
  text "2" at -21,-105 h10
  text "6" at 29,105 h10
  text "3" at 29,-105 h10
  text "4" at 79,-105 h10
  text "8" at -71,105 h10
  text "5" at 79,105 h10
Mechanical 16:
  region: -100,-122 100,-122 100,122 -100,122
  lines w1: -100,-122 -100,122 100,122 100,-122 -100,-122
3D body: height 150, standoff 0, extent -100,-122 100,122

## SOP16-50-150A [mil] "SOP16-50-150A"
pads (16):
  rect 25x65 smd: 1(-175,-112.5) 2(-125,-112.5) 3(-75,-112.5) 4(-25,-112.5) 5(25,-112.5) 6(75,-112.5) 7(125,-112.5) 8(175,-112.5) 9(175,112.5) 10(125,112.5) 11(75,112.5) 12(25,112.5) 13(-25,112.5) 14(-75,112.5) 15(-125,112.5) 16(-175,112.5)
Top Overlay:
  lines w10: -200,-30 -200,30 ; -200,-65 -200,-20 -160,-20 -160,20 -200,20 -200,65 200,65 200,-65 -200,-65
Mechanical 5:
  lines w10: -200,-30 -200,30 ; -200,-65 200,-65 200,65 -200,65 -200,20 -160,20 -160,-20 -200,-20 -200,-65
  text "U82" at -212.5,-35.01 h25
  text "MAX3232E_SOP16-50-150A_MAX3232E" at -100,100 h60
Mechanical 14:
  text "12" at 25,48.5 h80
  text "11" at 75,48.5 h80
  text "8" at 175,-144.5 h80
  text "2" at -125,-144.5 h80
  text "6" at 75,-144.5 h80
  text "7" at 125,-144.5 h80
  text "3" at -75,-144.5 h80
  text "4" at -25,-144.5 h80
  text "14" at -75,48.5 h80
  text "1" at -175,-144.5 h80
  text "13" at -25,48.5 h80
  text "5" at 25,-144.5 h80
  text "10" at 125,48.5 h80
  text "9" at 175,80.5 h80
  text "16" at -175,48.5 h80
  text "15" at -125,48.5 h80
Mechanical 16:
  region: -207.5,-147 207.5,-147 207.5,147 -207.5,147
3D body: height 150, standoff 0, extent -207.5,-147 207.5,147

## SOP65P640X150HGF-16N [mil] "SOP65P640X150HGF-16N"
pads (16):
  rect 59.06x17.72 smd: 1(-114.17,89.57) 2(-114.17,63.98) 3(-114.17,38.39) 4(-114.17,12.8) 5(-114.17,-12.8) 6(-114.17,-38.39) 7(-114.17,-63.98) 8(-114.17,-89.57) 9(114.17,-89.57) 10(114.17,-63.98) 11(114.17,-38.39) 12(114.17,-12.8) 13(114.17,12.8) 14(114.17,38.39) 15(114.17,63.98) 16(114.17,89.57)
Top Overlay:
  circle w9.84: c-133.86,118.11 r4.92
  circle w19.69: c-32.48,59.06 r9.84
  lines w7.87: -71.85,-98.43 -71.85,98.43 71.85,98.43 71.85,-98.43 -71.85,-98.43
Mechanical 5:
  circle w19.69: c-32.48,59.06 r9.84
  circle w9.84: c-133.86,118.11 r4.92
  lines w7.87: -71.85,-98.43 -71.85,98.43 71.85,98.43 71.85,-98.43 -71.85,-98.43
  text "U46" at 63.61,151.82 h25
  text "DS90LV032A_2_SOP65P640X150HGF-1" at 0,339.53 h25
Mechanical 14:
  text "2" at -114.17,73.98 h25
  text "14" at 114.17,58.39 h25
  text "15" at 114.17,83.98 h25
  text "6" at -114.17,-28.39 h25
  text "7" at -114.17,-53.98 h25
  text "9" at 114.17,-79.57 h25
  text "10" at 114.17,-43.98 h25
  text "13" at 114.17,32.8 h25
  text "11" at 114.17,-18.39 h25
  text "5" at -114.17,-2.8 h25
  text "3" at -114.17,48.39 h25
  text "1" at -114.17,99.57 h25
  text "16" at 114.17,109.57 h25
  text "4" at -114.17,22.8 h25
  text "8" at -114.17,-79.57 h25
  text "12" at 114.17,7.2 h25
Mechanical 16:
  circle w3.94: c-47.24,59.06 r19.69
  circle w1.97: c0,0 r13.78
  pour cut-out: -153.54,-110.24 -153.54,110.24 153.54,110.24 153.54,-110.24
  region: -153.54,-110.24 -153.54,110.24 153.54,110.24 153.54,-110.24
  lines w1.97: -19.69,0 19.69,0 ; 0,-19.69 0,19.69
  lines w3.94: -86.61,-98.43 -86.61,98.43 86.61,98.43 86.61,-98.43 -86.61,-98.43
Mechanical 17:
  text ".Designator" at 16.67,30 h25
3D body: height 150, standoff 0, extent -153.54,-110.24 153.54,110.24